# Altium footprint library Library_pcb.PcbLib: 59 footprints (part 1 of 4)
Each footprint in its own frame and in the unit in brackets; x right, y up, seen from the top. Pads: shape width x height; smd on the part's side, far side on the other; paste and mask are expansions set on the pad; w line width, h text height; cw(c..) or ccw(c..) is an arc to the next point about the centre after c.
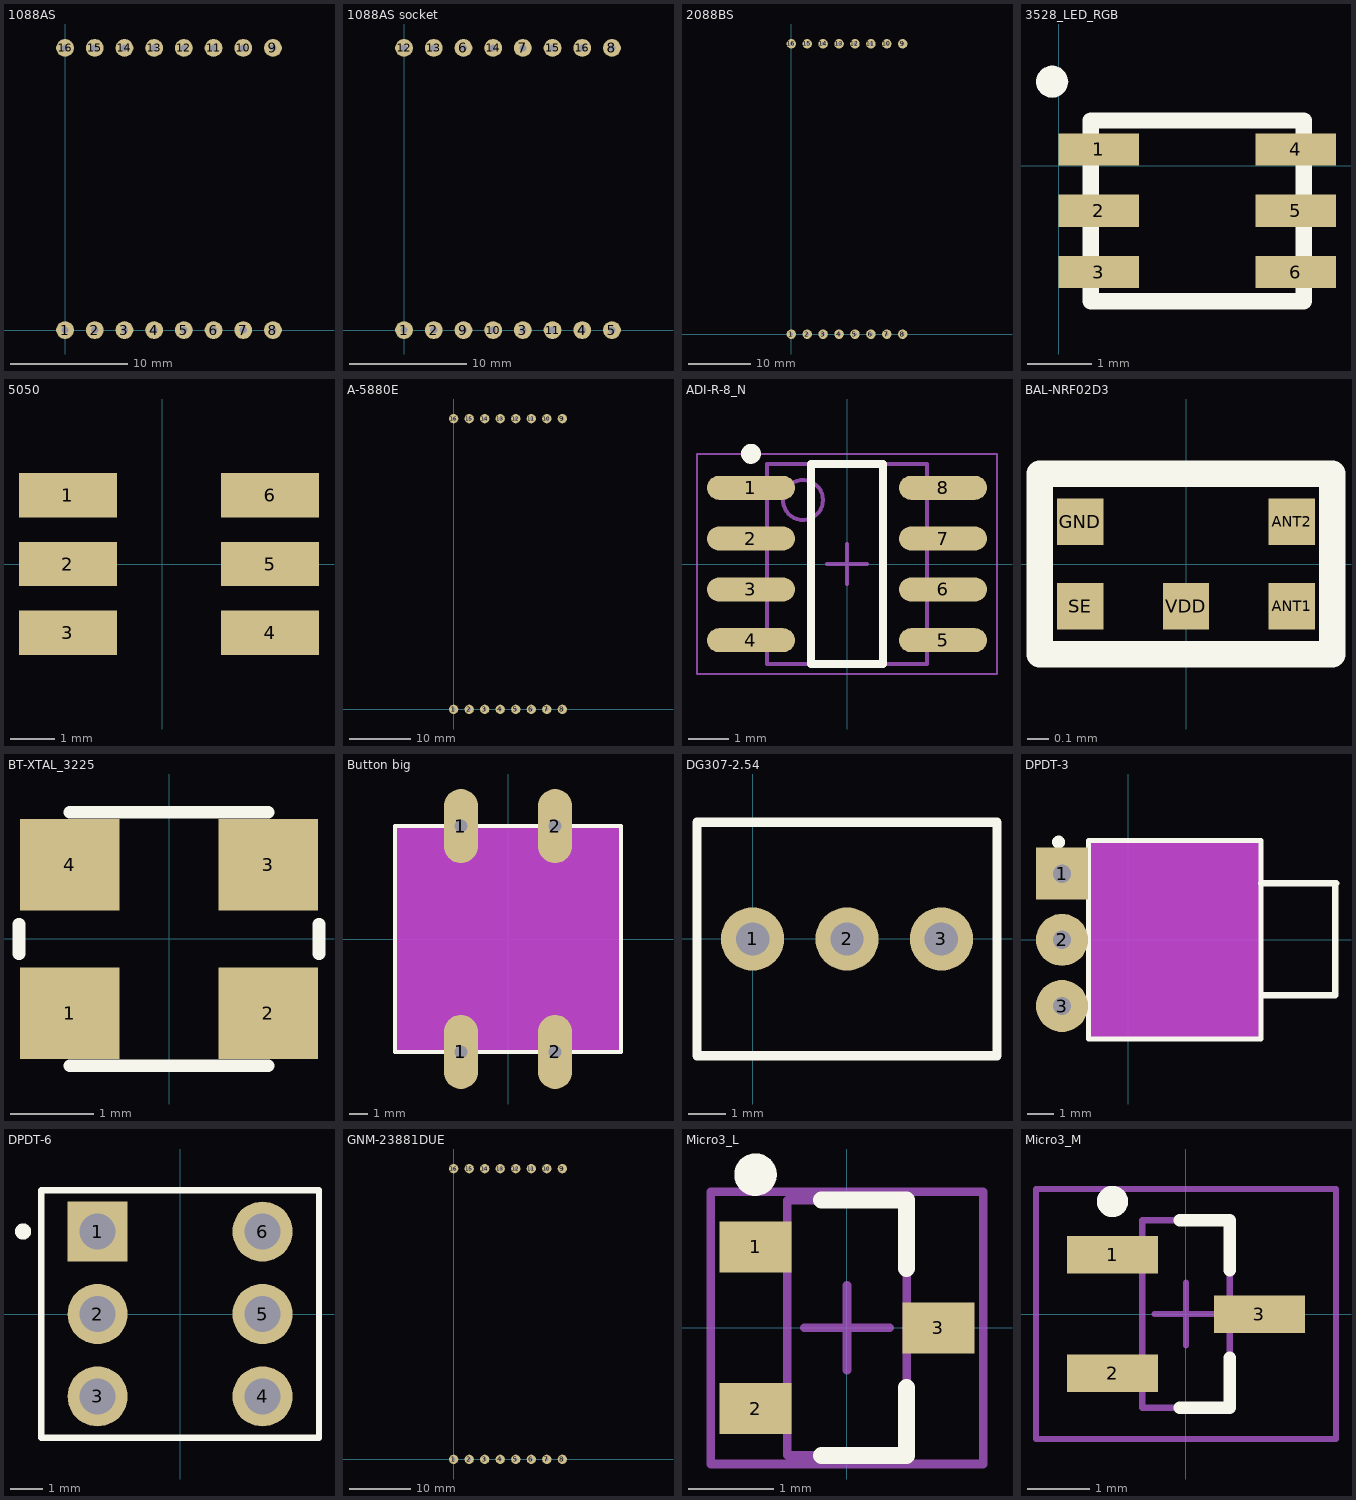
[diagram p0: the footprints below, top view; thin cyan lines are the x and y axes]

## 1088AS [mil] "led matrix 3mm"
pads (16):
  round 60 hole 23.62: 1(0,0) 2(100,0) 3(200,0) 4(300,0) 5(400,0) 6(500,0) 7(600,0) 8(700,0) 9(700,950) 10(600,950) 11(500,950) 12(400,950) 13(300,950) 14(200,950) 15(100,950) 16(0,950)
3D body "LED Matrix 3mm.STEP": height 276.09, standoff -141.23, extent -279.91,-154.91 979.93,1104.93

## 1088AS socket [mil] "led matrix 3mm"
pads (16):
  round 60 hole 23.62: 1(0,0) 2(100,0) 3(400,0) 4(600,0) 5(700,0) 6(200,950) 7(400,950) 8(700,950) 9(200,0) 10(300,0) 11(500,0) 12(0,950) 13(100,950) 14(300,950) 15(500,950) 16(600,950)
3D body "8 pin socket.STEP": height 165.5, standoff -124.5, extent -50,900 750,1000
3D body "8 pin socket.STEP": height 165.5, standoff -124.5, extent -50,-50 750,50

## 2088BS [mil] "led matrix 5mm"
pads (16):
  round 60 hole 23.62: 1(0,0) 2(100,0) 3(200,0) 4(300,0) 5(400,0) 6(500,0) 7(600,0) 8(700,0) 9(700,1825) 10(600,1825) 11(500,1825) 12(400,1825) 13(300,1825) 14(200,1825) 15(100,1825) 16(0,1825)
3D body "led_matrix.STEP": height 356.3, standoff -194.09, extent -823.61,-269.87 1553.55,2107.29

## 3528_LED_RGB [mm]
pads (7):
  rect 1.25x0.5 smd: 1(0.625,0.25) 2(0.625,-0.7) 3(0.625,-1.65) 4(3.675,0.25) 5(3.675,-0.7) 6(3.675,-1.65)
  round 0.5 on Top Overlay: ""(-0.1,1.3)
Top Overlay:
  lines w0.254: 0.5,-2.1 0.5,0.7 3.8,0.7 3.8,-2.1 0.5,-2.1

## 5050 [mm] "SMD RGB LED"
pads (6):
  rect 2.2x1 smd: 1(-2.125,1.55) 2(-2.125,0) 3(-2.125,-1.55) 4(2.425,-1.55) 5(2.425,0) 6(2.425,1.55)
3D body "User Library-smd_led_5050.STEP": height 1.6, standoff 0, extent -2.5,-2.5 2.8,2.5

## A-5880E [mil] "led matrix 5mm"
pads (16):
  round 60 hole 23.62: 1(0,0) 2(100,0) 3(200,0) 4(300,0) 5(400,0) 6(500,0) 7(600,0) 8(700,0) 9(700,1872.44) 10(600,1872.44) 11(500,1872.44) 12(400,1872.44) 13(300,1872.44) 14(200,1872.44) 15(100,1872.44) 16(0,1872.44)
3D body "led_matrix.STEP": height 356.3, standoff -194.09, extent -823.61,-244.87 1553.55,2132.29

## ADI-R-8_N [mm] "SOIC, 8-Leads, Body 4.9x3.9mm, Pitch 1.27mm, IPC Medium Density"
height 1.75
pads (8):
  oval 2.2x0.6 smd: 1(-2.4,1.905) 2(-2.4,0.635) 3(-2.4,-0.635) 4(-2.4,-1.905) 5(2.4,-1.905) 6(2.4,-0.635) 7(2.4,0.635) 8(2.4,1.905)
Top Overlay:
  circle w0.25: c-2.4,2.755 r0.125
  lines w0.2: -0.9,-2.5 -0.9,2.5 0.9,2.5 0.9,-2.5 -0.9,-2.5
Mechanical 13:
  circle w0.1: c-1.1,1.6 r0.5
  lines w0.1: -2,-2.5 -2,2.5 2,2.5 2,-2.5 -2,-2.5
Mechanical 15:
  lines w0.05: -3.75,-2.75 -3.75,2.75 3.75,2.75 3.75,-2.75 -3.75,-2.75
  lines w0.1: -0.5,0 0.5,0 ; 0,-0.5 0,0.5
3D body: height 1.75, standoff 0.1, extent -2,-2.5 2,2.5

## BAL-NRF02D3 [mm]
pads (5):
  rect 0.22x0.22 smd paste-25.4 mask-25.4: ANT1(0.5,-0.2) ANT2(0.5,0.2) GND(-0.5,0.2) SE(-0.5,-0.2) VDD(0,-0.2)
Top Overlay:
  lines w0.127: -0.693,-0.427 -0.693,0.427 0.693,0.427 0.693,-0.427 -0.693,-0.427
Top Paste:
  region: 0.39,-0.31 0.61,-0.31 0.61,-0.09 0.39,-0.09
  region: -0.61,-0.31 -0.39,-0.31 -0.39,-0.09 -0.61,-0.09
  region: 0.39,0.09 0.61,0.09 0.61,0.31 0.39,0.31
  region: -0.11,-0.31 0.11,-0.31 0.11,-0.09 -0.11,-0.09
  region: -0.61,0.09 -0.39,0.09 -0.39,0.31 -0.61,0.31
Top Solder:
  region: 0.29,-0.41 0.71,-0.41 0.71,0.01 0.29,0.01
  region: -0.71,-0.41 -0.29,-0.41 -0.29,0.01 -0.71,0.01
  region: 0.29,-0.01 0.71,-0.01 0.71,0.41 0.29,0.41
  region: -0.21,-0.41 0.21,-0.41 0.21,0.01 -0.21,0.01
  region: -0.71,-0.01 -0.29,-0.01 -0.29,0.41 -0.71,0.41

## BT-XTAL_3225 [mm]
pads (4):
  rect 1.2x1.1 smd: 1(-1.194,-0.89) 2(1.194,-0.89) 3(1.194,0.891) 4(-1.194,0.891)
Top Overlay:
  lines w0.152: -1.803,-0.178 -1.803,0.178 ; -1.194,-1.524 1.194,-1.524 ; -1.194,1.524 1.194,1.524 ; 1.803,-0.178 1.803,0.178
3D body "User Library-GeyerElectronics_KX7.step": height 0.81, standoff 0, extent -1.6,-1.25 1.614,1.25
3D body: height 0.81, standoff 0.15, extent -1.4,-1.05 1.4,1.05

## Button big [mm] "Switch; 4 Leads"
pads (4):
  oval 1.85x4 hole 0.7: 1(-2.54,-6.096) 1(-2.54,6.096) 2(2.54,-6.096) 2(2.54,6.096)
Top Overlay:
  lines w0.2: -6.096,-6.096 6.096,-6.096 6.096,6.096 -6.096,6.096 -6.096,-6.096
Mechanical 1 keep-out:
  region: -6.096,-6.096 -6.096,6.096 6.096,6.096 6.096,-6.096

## DG307-2.54 [mm]
pads (3):
  round 1.7 hole 0.9: 1(0,0) 2(2.54,0) 3(5.08,0)
Top Overlay:
  lines w0.254: -1.495,-3.14 -1.495,3.14 6.575,3.14 6.575,-3.14 -1.495,-3.14

## DPDT-3 [mm] "Switch; 3 Leads"
pads (3):
  rect 2x2 hole 0.7: 1(-2.54,2.54)
  round 2 hole 0.7: 2(-2.54,0) 3(-2.54,-2.54)
Top Overlay:
  circle w0.25: c-2.675,3.75 r0.125
  lines w0.2: -1.525,-3.81 5.1,-3.81 5.1,3.81 -1.525,3.81 -1.525,-3.81
  lines w0.254: 5.1,2.175 7.975,2.175 7.95,2.15 7.95,-2.125 ; 5.175,-2.125 7.95,-2.125 ; 7.95,-2.125 7.95,-2.125
Mechanical 1 keep-out:
  region: -1.525,-3.81 5.1,-3.81 5.1,3.81 -1.525,3.81

## DPDT-6 [mm] "Switch; 6 Leads"
pads (6):
  rect 1.85x1.85 hole 1.1: 1(-2.54,2.54)
  round 1.85 hole 1.1: 2(-2.54,0) 3(-2.54,-2.54) 4(2.54,-2.54) 5(2.54,0) 6(2.54,2.54)
Top Overlay:
  circle w0.25: c-4.836,2.541 r0.125
  lines w0.2: -4.28,-3.81 -4.28,3.81 4.28,3.81 4.28,-3.81 -4.28,-3.81

## GNM-23881DUE [mil] "brght led matrix 5mm"
pads (16):
  round 60 hole 23.62: 1(0,0) 2(100,0) 3(200,0) 4(300,0) 5(400,0) 6(500,0) 7(600,0) 8(700,0) 9(700,1872.44) 10(600,1872.44) 11(500,1872.44) 12(400,1872.44) 13(300,1872.44) 14(200,1872.44) 15(100,1872.44) 16(0,1872.44)
3D body "led_matrix.STEP": height 356.3, standoff -194.09, extent -823.61,-244.87 1553.55,2132.29

## Micro3_L [mm] "SOT23, 3-Leads, Body 2.9x1.3mm, Pitch 0.95mm, Lead Span 2.3mm, IPC High Density"
height 1.12
pads (3):
  rect 0.85x0.6 smd: 1(-1.075,0.95) 2(-1.075,-0.95) 3(1.075,0)
Top Overlay:
  circle w0.25: c-1.075,1.8 r0.125
  lines w0.2: -0.3,-1.5 0.7,-1.5 0.7,-0.7 ; -0.3,1.5 0.7,1.5 0.7,0.7
Mechanical 13:
  lines w0.1: -0.7,-1.5 0.7,-1.5 0.7,1.5 -0.7,1.5 -0.7,-1.5
Mechanical 15:
  lines w0.1: -0.5,0 0.5,0 ; 0,-0.5 0,0.5 ; -1.6,-1.6 1.6,-1.6 1.6,1.6 -1.6,1.6 -1.6,-1.6
3D body: height 1.12, standoff 0, extent -0.7,-1.5 0.7,1.5

## Micro3_M [mm] "SOT23, 3-Leads, Body 2.9x1.3mm, Pitch 0.95mm, Lead Span 2.3mm, IPC Low Density"
height 1.12
pads (3):
  rect 1.45x0.6 smd: 1(-1.175,0.95) 2(-1.175,-0.95) 3(1.175,0)
Top Overlay:
  circle w0.25: c-1.175,1.8 r0.125
  lines w0.2: -0.1,-1.5 0.7,-1.5 0.7,-0.7 ; -0.1,1.5 0.7,1.5 0.7,0.7
Mechanical 13:
  lines w0.1: -0.7,-1.5 0.7,-1.5 0.7,1.5 -0.7,1.5 -0.7,-1.5
Mechanical 15:
  lines w0.1: -0.5,0 0.5,0 ; 0,-0.5 0,0.5 ; -2.4,-2 2.4,-2 2.4,2 -2.4,2 -2.4,-2
3D body: height 1.12, standoff 0, extent -0.7,-1.5 0.7,1.5